# Altium footprint library THU VIEN V1.PcbLib: 400 footprints (part 3 of 25)
Each footprint in its own frame and in the unit in brackets; x right, y up, seen from the top. Pads: shape width x height; smd on the part's side, far side on the other; paste and mask are expansions set on the pad; w line width, h text height; cw(c..) or ccw(c..) is an arc to the next point about the centre after c.
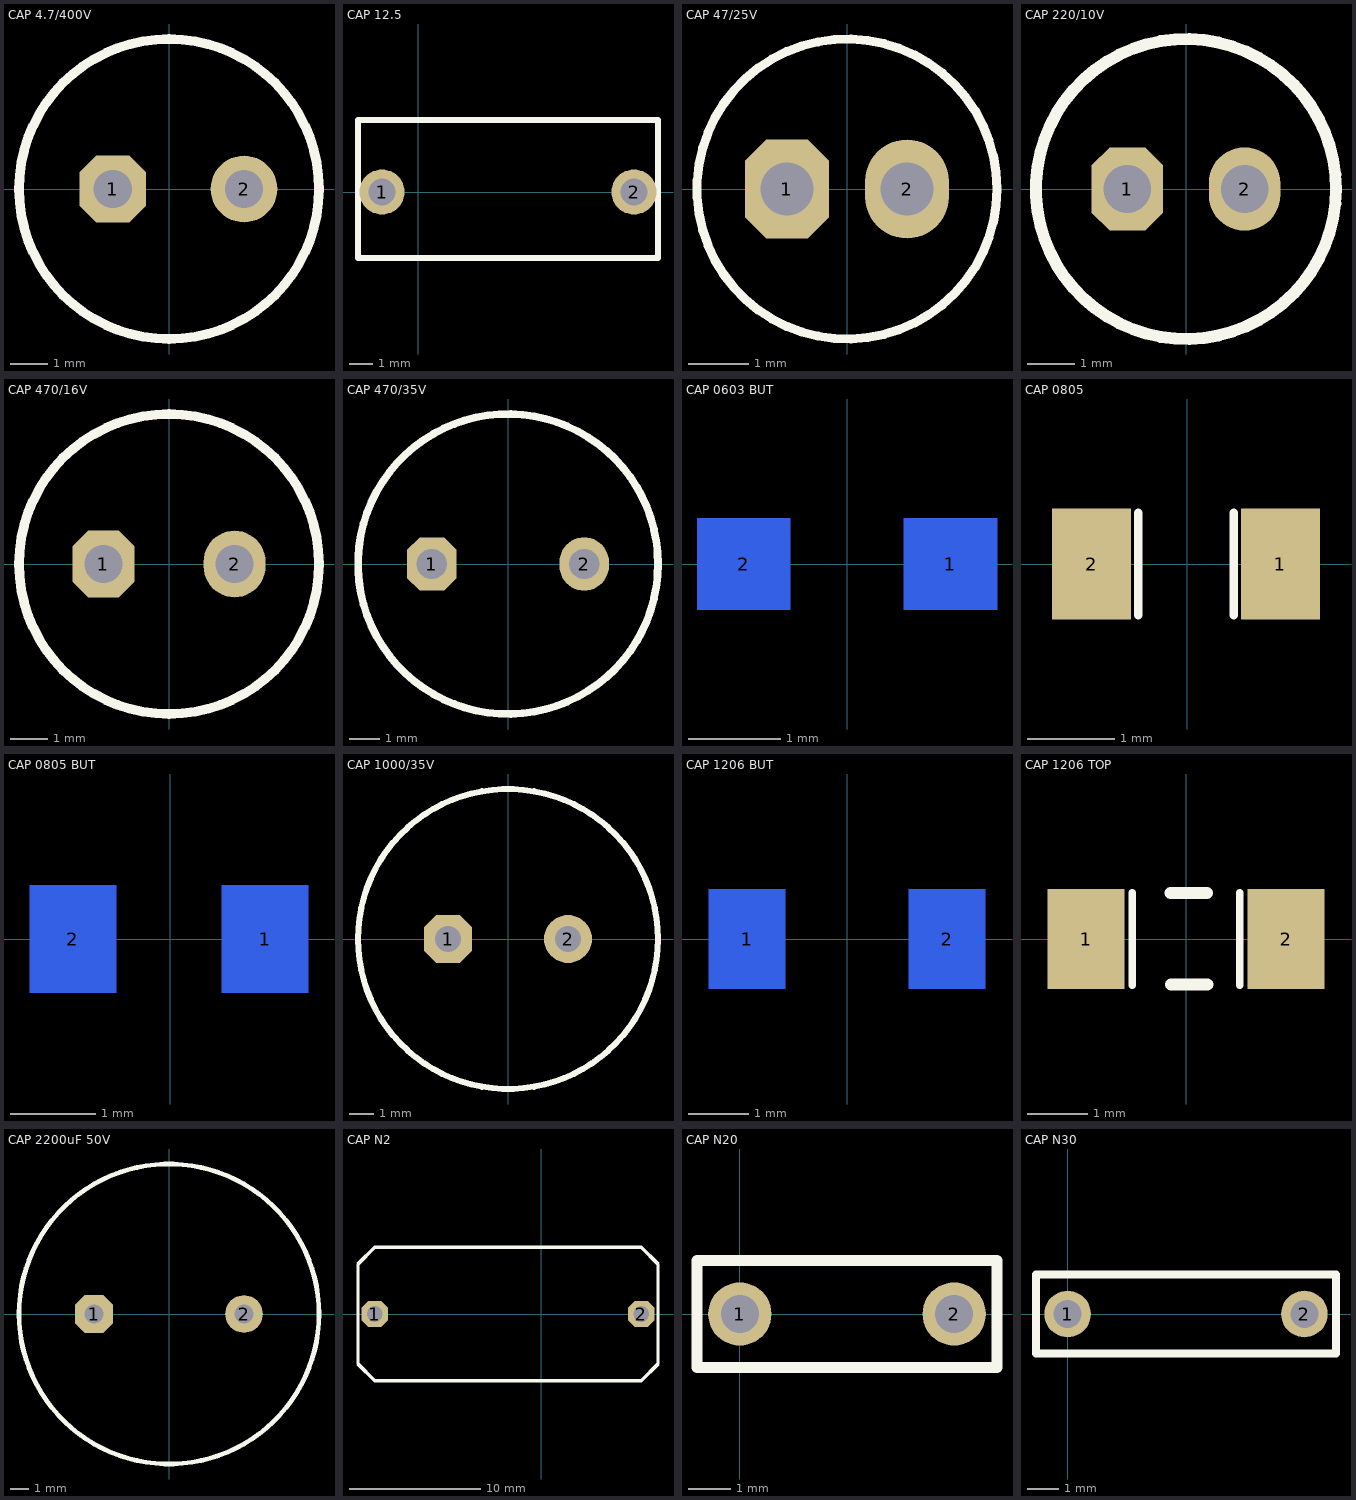
[diagram p2: the footprints below, top view; thin cyan lines are the x and y axes]

## CAP 4.7/400V [mil]
pads (2):
  oct 70x70 hole 40: 1(-59.06,0)
  round 70 hole 40: 2(78.74,0)
Top Overlay:
  circle w10: c0,0 r157.48
3D body: height 454.24, standoff -746.06, extent -157.48,-157.48 157.48,157.48

## CAP 12.5 [mil]
pads (2):
  round 75 hole 45: 1(-60,0) 2(360,0)
Top Overlay:
  lines w10: -100,-110 -100,120 400,120 400,-110 -100,-110
3D body: height 439.21, standoff -364.35, extent -96.06,-112.28 396.06,120

## CAP 47/25V [mil]
pads (2):
  oct 55x65 hole 35: 1(-39.37,0)
  oval 55x65 hole 35: 2(39.37,0)
Top Overlay:
  circle w5.91: c0,0 r98.43
3D body: height 29.82, standoff -471.19, extent -101.4,-102.04 103.54,100.48

## CAP 220/10V [mil]
pads (2):
  oct 60x70 hole 40: 1(-49.21,0)
  oval 60x70 hole 40: 2(49.21,0)
Top Overlay:
  circle w10: c0,0 r125.98
3D body: height 437.01, standoff -744.09, extent -125.98,-125.98 122.05,122.05

## CAP 470/16V [mil]
pads (2):
  oct 65x70 hole 40: 1(-68.9,0)
  oval 65x70 hole 40: 2(68.9,0)
Top Overlay:
  circle w10: c0,0 r157.48
3D body: height 477.44, standoff -93.43, extent -156.49,-158.46 158.47,156.5

## CAP 470/35V [mil]
pads (2):
  oct 65x70 hole 40: 1(-100,0)
  oval 65x70 hole 40: 2(100,0)
Top Overlay:
  circle w10: c0,0 r196.85
3D body: height 472.44, standoff -98.43, extent -196.84,-196.84 196.86,196.86

## CAP 0603 BUT [mm]
pads (2):
  rect 1.016x1 smd far side: 1(1.125,0) 2(-1.125,0)
Bottom Overlay:
  lines w0.1: -0.575,-0.4 -0.575,0.4 ; 0.575,-0.4 0.575,0.4
3D body: height -0.41, standoff -1.2, extent -1,-0.394 1,0.394

## CAP 0805 [mm]
pads (2):
  rect 0.9x1.27 smd: 1(1.067,0) 2(-1.092,0)
Top Overlay:
  lines w0.1: -0.559,-0.584 -0.559,0.584 ; 0.533,-0.584 0.533,0.584
3D body: height 0.78, standoff 0, extent -1,-0.625 1,0.625

## CAP 0805 BUT [mil]
pads (2):
  rect 40x50 smd far side: 1(44,0) 2(-45,0)
Bottom Overlay:
  lines w3.94: -23,-23 -23,23 ; 22,-23 22,23
3D body: height -16, standoff -46.79, extent -39.36,-24.6 39.38,24.61

## CAP 1000/35V [mm]
pads (2):
  oct 2x2 hole 1.1: 1(-2.5,0)
  round 2 hole 1.1: 2(2.5,0)
Top Overlay:
  circle w0.254: c0,0 r6.25
3D body: height 19.99, standoff -19, extent -6.275,-6.2 6.225,6.3

## CAP 1206 BUT [mil]
pads (2):
  rect 50x65 smd far side: 1(-65,0) 2(65,0)
Bottom Overlay:
  lines w5: -35,-30 -35,30 ; 35,-30 35,30
3D body: height -15, standoff -54.45, extent -62.99,-31.49 63,31.5

## CAP 1206 TOP [mil]
pads (2):
  rect 50x65 smd: 1(-65,0) 2(65,0)
Top Overlay:
  lines w5: -35,-30 -35,30 ; 35,-30 35,30
  lines w7.87: -10,30 13.62,30 ; -9.81,-29.5 13.81,-29.5
3D body: height 39.45, standoff 0, extent -62.99,-31.49 63,31.5

## CAP 2200uF 50V [mm]
pads (2):
  oct 2x2 hole 1.016: 1(-4,0)
  round 2 hole 1.016: 2(4,0)
Top Overlay:
  circle w0.254: c0,0 r8
3D body: height 25, standoff -19, extent -8,-8 8,8

## CAP N2 [mm]
pads (2):
  oct 2x2 hole 1.2: 1(-12.7,0) 2(7.62,0)
Top Overlay:
  lines w0.254: -13.97,-3.81 -13.97,3.81 -12.7,5.08 7.62,5.08 8.89,3.81 8.89,-3.81 7.62,-5.08 -12.7,-5.08 -13.97,-3.81
3D body: height 17.16, standoff -9.33, extent -12.25,-3 6.25,3.8

## CAP N20 [mm]
pads (2):
  round 1.5 hole 0.9: 1(0,0) 2(5.08,0)
Top Overlay:
  lines w0.254: -1.016,-1.27 -1.016,1.27 6.096,1.27 6.096,-1.27 -1.016,-1.27

## CAP N30 [mm]
pads (2):
  round 1.5 hole 0.9: 1(0,0) 2(7.62,0)
Top Overlay:
  lines w0.254: -1.016,-1.27 8.636,-1.27 8.636,1.27 -1.016,1.27 -1.016,-1.27